# Altium footprint library IC.PcbLib: 163 footprints (part 8 of 11)
Each footprint in its own frame and in the unit in brackets; x right, y up, seen from the top. Pads: shape width x height; smd on the part's side, far side on the other; paste and mask are expansions set on the pad; w line width, h text height; cw(c..) or ccw(c..) is an arc to the next point about the centre after c.
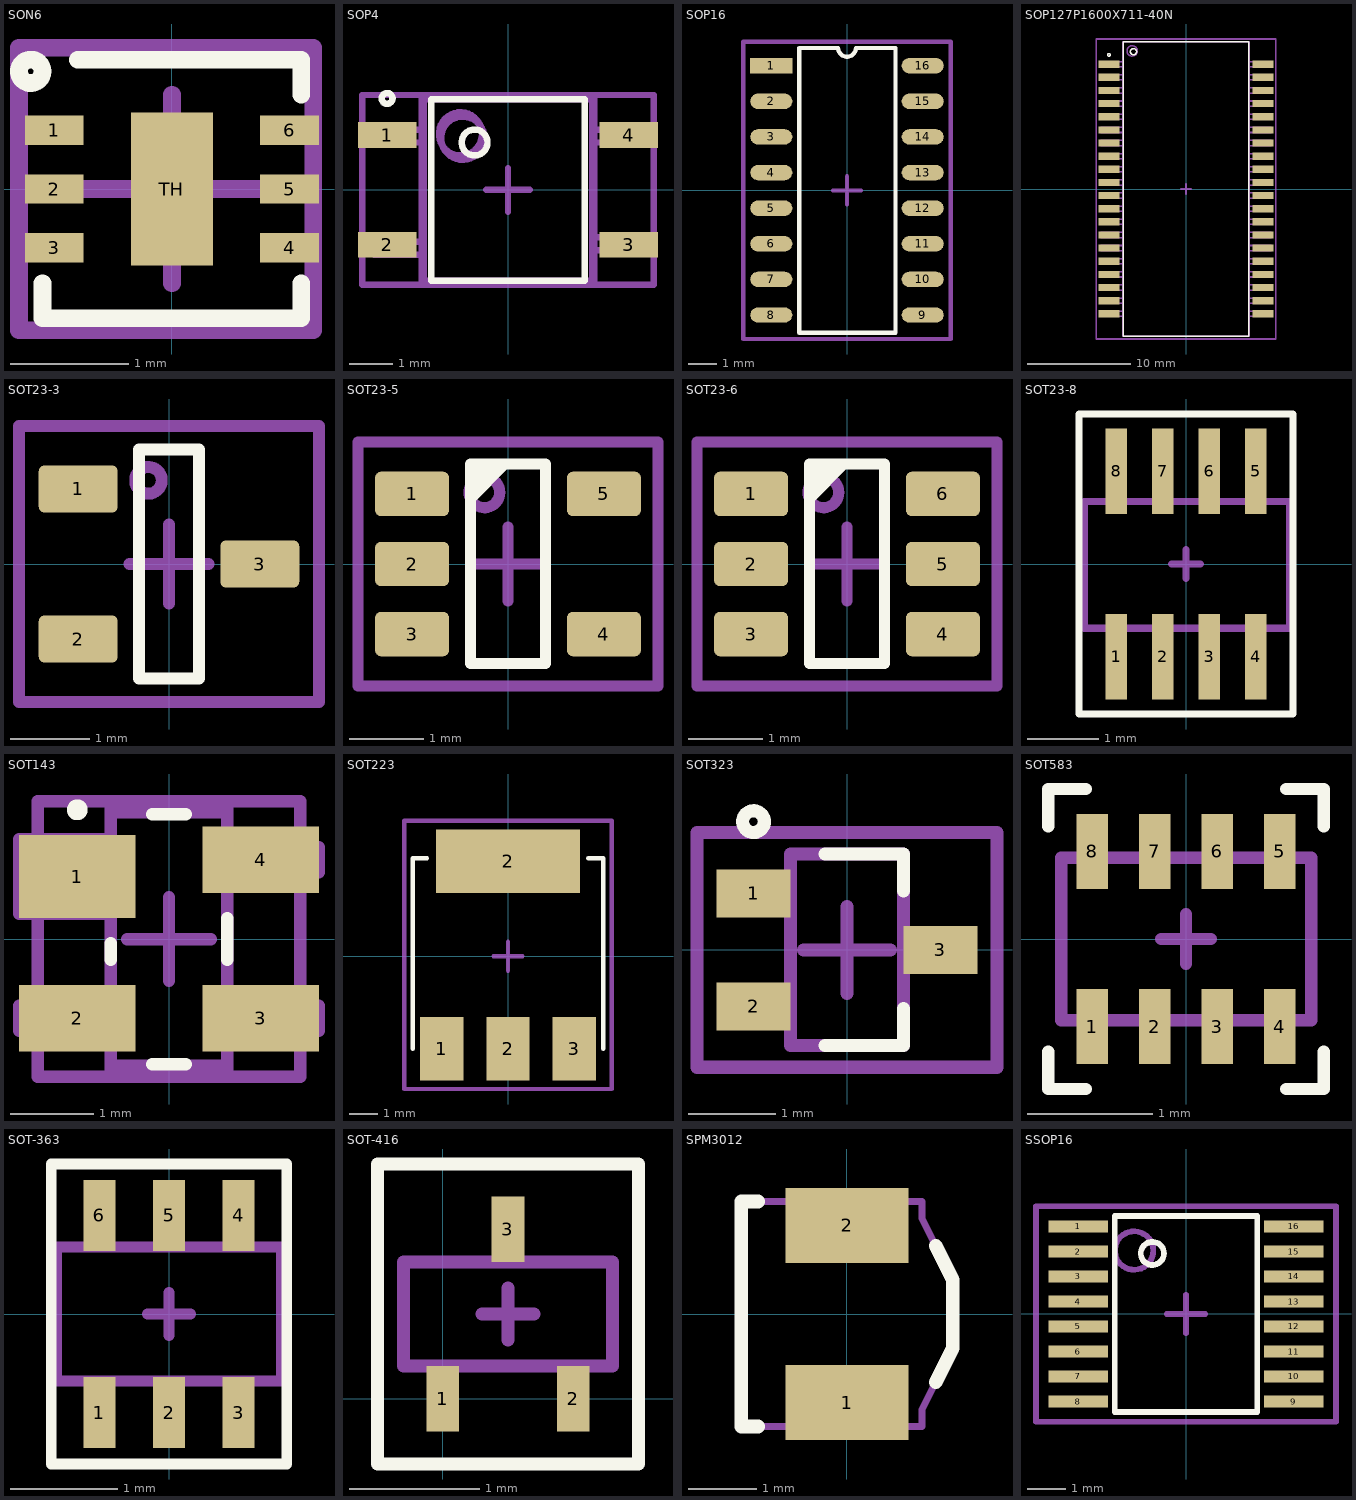
[diagram p7: the footprints below, top view; thin cyan lines are the x and y axes]

## SON6 [mm]
height 1
pads (7):
  rect 0.5x0.25 smd: 1(-1,0.5) 2(-1,0) 3(-1,-0.5) 4(1,-0.5) 5(1,0) 6(1,0.5)
  rect 0.7x1.3 smd: TH(0,0)
Top Overlay:
  circle w0.15: c-1.2,1 r0.1
  lines w0.15: -1.1,-0.8 -1.1,-1.1 1.1,-1.1 1.1,-0.8 ; -0.8,1.1 1.1,1.1 1.1,0.8
Mechanical 15:
  lines w0.15: -0.8,0 0,0 ; 0,-0.8 0,0 ; 0,0.8 0,0 ; 0.8,0 0,0 ; -1.3,-1.2 -1.3,1.2 1.2,1.2 1.2,-1.2 -1.3,-1.2
3D body: height 0.8, standoff 0, extent -1,-1 1,1

## SOP4 [mm] "SOP, 4-Leads, Body 4,00x3,79mm, Pitch 2,54mm, IPC High Density"
height 2.19
pads (4):
  rect 1.35x0.6 smd: 1(-2.8,1.27) 2(-2.8,-1.27) 3(2.8,-1.27) 4(2.8,1.27)
Top Overlay:
  circle w0.15: c-0.775,1.1 r0.3
  circle w0.15: c-2.8,2.12 r0.125
  lines w0.15: -1.775,-2.1 1.775,-2.1 1.775,2.1 -1.775,2.1 -1.775,-2.1
Mechanical 13:
  circle w0.15: c-1.05,1.2 r0.5
  lines w0.15: -1.95,-2.1 1.95,-2.1 1.95,2.1 -1.95,2.1 -1.95,-2.1
Mechanical 15:
  lines w0.15: -0.5,0 0.5,0 ; 0,-0.5 0,0.5 ; -3.375,-2.2 3.375,-2.2 3.375,2.2 -3.375,2.2 -3.375,-2.2
Mechanical 29:
  circle w0.15: c-1.1,1.3 r0.5
  lines w0.15: -2,-1.5 -3.1,-1.5 -3.1,-1.2 -2,-1.2 ; -2,1.1 -3.1,1.1 -3.1,1.4 -2,1.4 ; 2,-1.4 3.1,-1.4 3.1,-1.1 2,-1.1 ; 2,1.1 3.1,1.1 3.1,1.4 2,1.4 ; -2,-2.2 2,-2.2 2,2.2 -2,2.2 -2,-2.2
  text ".Designator" at -1.8,-0.5 h1
3D body "SOP4.step": height 2.18, standoff 0, extent -3.025,-2.1 3.025,2.1

## SOP16 [mm]
pads (16):
  rect 1.5x0.55 smd: 1(-2.7,4.445)
  oval 1.5x0.55 smd: 2(-2.7,3.175) 3(-2.7,1.905) 4(-2.7,0.635) 5(-2.7,-0.635) 6(-2.7,-1.905) 7(-2.7,-3.175) 8(-2.7,-4.445) 9(2.7,-4.445) 10(2.7,-3.175) 11(2.7,-1.905) 12(2.7,-0.635) 13(2.7,0.635) 14(2.7,1.905) 15(2.7,3.175) 16(2.7,4.445)
Top Overlay:
  lines w0.15: -1.7,-5.08 1.725,-5.08 1.725,5.08 0.318,5.08 cw(c0,5.08) -0.318,5.08 -1.7,5.08 -1.7,-5.08
  text "." at -2.7,5.145 h0.1
Mechanical 15:
  lines w0.15: -0.5,0 0.5,0 ; 0,-0.5 0,0.5 ; -3.7,-5.3 3.7,-5.3 3.7,5.3 -3.7,5.3 -3.7,-5.3
3D body "SOIC16.STEP": height 1.75, standoff 0, extent -3.1,-4.955 3.1,4.945

## SOP127P1600X711-40N [mm] "SOP, 40-Leads, Body 28,50x12,19mm, Pitch 1,27mm, IPC Medium Density"
height 7.11
pads (40):
  rect 2x0.7 smd: 1(-7.45,12.065) 2(-7.45,10.795) 3(-7.45,9.525) 4(-7.45,8.255) 5(-7.45,6.985) 6(-7.45,5.715) 7(-7.45,4.445) 8(-7.45,3.175) 9(-7.45,1.905) 10(-7.45,0.635) 11(-7.45,-0.635) 12(-7.45,-1.905) 13(-7.45,-3.175) 14(-7.45,-4.445) 15(-7.45,-5.715) 16(-7.45,-6.985) 17(-7.45,-8.255) 18(-7.45,-9.525) 19(-7.45,-10.795) 20(-7.45,-12.065) 21(7.45,-12.065) 22(7.45,-10.795) 23(7.45,-9.525) 24(7.45,-8.255) 25(7.45,-6.985) 26(7.45,-5.715) 27(7.45,-4.445) 28(7.45,-3.175) 29(7.45,-1.905) 30(7.45,-0.635) 31(7.45,0.635) 32(7.45,1.905) 33(7.45,3.175) 34(7.45,4.445) 35(7.45,5.715) 36(7.45,6.985) 37(7.45,8.255) 38(7.45,9.525) 39(7.45,10.795) 40(7.45,12.065)
Top Overlay:
  circle w0.15: c-7.45,12.965 r0.125
  circle w0.15: c-5.075,13.275 r0.3
  lines w0.15: -6.05,-14.25 -6.05,14.25 6.05,14.25 6.05,-14.25 -6.05,-14.25
Mechanical 15:
  lines w0.15: -0.5,0 0.5,0 ; 0,-0.5 0,0.5 ; -8.675,-14.5 -8.675,14.5 8.675,14.5 8.675,-14.5 -8.675,-14.5
Mechanical 29:
  circle w0.15: c-5.2,13.35 r0.5
  lines w0.15: -6.096,-12.319 -8.255,-12.319 -8.255,-11.811 -6.096,-11.811 ; -6.096,-11.049 -8.255,-11.049 -8.255,-10.541 -6.096,-10.541 ; -6.096,-9.779 -8.255,-9.779 -8.255,-9.271 -6.096,-9.271 ; -6.096,-8.509 -8.255,-8.509 -8.255,-8.001 -6.096,-8.001 ; -6.096,-7.239 -8.255,-7.239 -8.255,-6.731 -6.096,-6.731 ; -6.096,-5.969 -8.255,-5.969 -8.255,-5.461 -6.096,-5.461 ; -6.096,-4.699 -8.255,-4.699 -8.255,-4.191 -6.096,-4.191 ; -6.096,-3.429 -8.255,-3.429 -8.255,-2.921 -6.096,-2.921 ; -6.096,-2.159 -8.255,-2.159 -8.255,-1.651 -6.096,-1.651 ; -6.096,-0.889 -8.255,-0.889 -8.255,-0.381 -6.096,-0.381 ; -6.096,0.381 -8.255,0.381 -8.255,0.889 -6.096,0.889 ; -6.096,1.651 -8.255,1.651 -8.255,2.159 -6.096,2.159 ; -6.096,2.921 -8.255,2.921 -8.255,3.429 -6.096,3.429 ; -6.096,4.191 -8.255,4.191 -8.255,4.699 -6.096,4.699 ; -6.096,5.461 -8.255,5.461 -8.255,5.969 -6.096,5.969 ; -6.096,6.731 -8.255,6.731 -8.255,7.239 -6.096,7.239 ; -6.096,8.001 -8.255,8.001 -8.255,8.509 -6.096,8.509 ; -6.096,9.271 -8.255,9.271 -8.255,9.779 -6.096,9.779 ; -6.096,10.541 -8.255,10.541 -8.255,11.049 -6.096,11.049 ; -6.096,11.811 -8.255,11.811 -8.255,12.319 -6.096,12.319 ; 6.096,-12.319 8.255,-12.319 8.255,-11.811 6.096,-11.811 ; 6.096,-11.049 8.255,-11.049 8.255,-10.541 6.096,-10.541 ; 6.096,-9.779 8.255,-9.779 8.255,-9.271 6.096,-9.271 ; 6.096,-8.509 8.255,-8.509 8.255,-8.001 6.096,-8.001 ; 6.096,-7.239 8.255,-7.239 8.255,-6.731 6.096,-6.731 ; 6.096,-5.969 8.255,-5.969 8.255,-5.461 6.096,-5.461 ; 6.096,-4.699 8.255,-4.699 8.255,-4.191 6.096,-4.191 ; 6.096,-3.429 8.255,-3.429 8.255,-2.921 6.096,-2.921 ; 6.096,-2.159 8.255,-2.159 8.255,-1.651 6.096,-1.651 ; 6.096,-0.889 8.255,-0.889 8.255,-0.381 6.096,-0.381 ; 6.096,0.381 8.255,0.381 8.255,0.889 6.096,0.889 ; 6.096,1.651 8.255,1.651 8.255,2.159 6.096,2.159 ; 6.096,2.921 8.255,2.921 8.255,3.429 6.096,3.429 ; 6.096,4.191 8.255,4.191 8.255,4.699 6.096,4.699 ; 6.096,5.461 8.255,5.461 8.255,5.969 6.096,5.969 ; 6.096,6.731 8.255,6.731 8.255,7.239 6.096,7.239 ; 6.096,8.001 8.255,8.001 8.255,8.509 6.096,8.509 ; 6.096,9.271 8.255,9.271 8.255,9.779 6.096,9.779 ; 6.096,10.541 8.255,10.541 8.255,11.049 6.096,11.049 ; 6.096,11.811 8.255,11.811 8.255,12.319 6.096,12.319 ; -6.1,-14.25 -6.1,14.25 6.1,14.25 6.1,-14.25 -6.1,-14.25
  text ".Designator" at -3.2,-0.5 h1
3D body: height 7.11, standoff 0.25, extent -6.1,-14.25 6.1,14.25

## SOT23-3 [mm] "SOT23, 3 pin"
height 1.003
pads (3):
  rrect25% 1x0.6 smd: 1(-1.15,0.95) 2(-1.15,-0.95) 3(1.15,0)
Top Overlay:
  lines w0.15: -0.381,-1.45 -0.381,1.45 0.381,1.45 0.381,-1.45 -0.381,-1.45
  text "." at -2.125,0.95 h0.1
Mechanical 13:
  circle w0.15: c-0.26,1.06 r0.169
Mechanical 15:
  lines w0.15: -0.5,0 0.5,0 ; 0,-0.5 0,0.5 ; -1.9,-1.75 -1.9,1.75 1.9,1.75 1.9,-1.75 -1.9,-1.75
3D body: height 1.29, standoff -0.01, extent -1.4,-1.45 1.4,1.45

## SOT23-5 [mm]
height 1.6
pads (5):
  rrect25% 1x0.6 smd: 1(-1.3,0.95) 2(-1.3,0) 3(-1.3,-0.95) 4(1.3,-0.95) 5(1.3,0.95)
Top Overlay:
  region: -0.508,1.353 0.053,1.353 -0.508,0.792
  lines w0.15: -0.508,-1.347 0.508,-1.347 0.508,1.353 -0.508,1.353 -0.508,-1.347
  text "." at -2.275,0.95 h0.1
Mechanical 13:
  circle w0.15: c-0.32,0.97 r0.208
Mechanical 15:
  lines w0.15: -0.5,0 0.5,0 ; 0,-0.5 0,0.5 ; -2.032,-1.651 2.032,-1.651 2.032,1.651 -2.032,1.651 -2.032,-1.651
3D body: height 1.44, standoff -0.01, extent -1.4,-1.45 1.4,1.45

## SOT23-6 [mm]
height 1.6
pads (6):
  rrect25% 1x0.6 smd: 1(-1.3,0.95) 2(-1.3,0) 3(-1.3,-0.95) 4(1.3,-0.95) 5(1.3,0) 6(1.3,0.95)
Top Overlay:
  region: -0.508,1.353 0.053,1.353 -0.508,0.792
  lines w0.15: -0.508,-1.347 -0.508,1.353 0.508,1.353 0.508,-1.347 -0.508,-1.347
  text "." at -2.275,0.95 h0.1
Mechanical 13:
  circle w0.15: c-0.32,0.97 r0.208
Mechanical 15:
  lines w0.15: -0.5,0 0.5,0 ; 0,-0.5 0,0.5 ; -2.032,-1.651 -2.032,1.651 2.032,1.651 2.032,-1.651 -2.032,-1.651
3D body: height 1.44, standoff -0.01, extent -1.4,-1.45 1.4,1.45

## SOT23-8 [mm]
pads (8):
  rect 0.3x1.2 smd: 1(-0.975,-1.3) 2(-0.325,-1.3) 3(0.325,-1.3) 4(0.975,-1.3) 5(0.975,1.3) 6(0.325,1.3) 7(-0.325,1.3) 8(-0.975,1.3)
Top Overlay:
  lines w0.1: -1.5,-2.1 1.5,-2.1 1.5,2.1 -1.5,2.1 -1.5,-2.1
Mechanical 32:
  lines w0.1: -0.2,0 0.2,0 ; 0,-0.2 0,0.2 ; -1.425,-0.9 -1.425,0.875 1.45,0.875 1.45,-0.9 -1.425,-0.9
3D body: height 0.2, standoff 0.1, extent -1.125,-1.4 -0.825,-0.9
3D body: height 0.2, standoff 0.1, extent -0.475,-1.4 -0.175,-0.9
3D body: height 0.2, standoff 0.1, extent 0.825,-1.4 1.125,-0.9
3D body: height 0.2, standoff 0.1, extent 0.175,-1.4 0.475,-0.9
3D body: height 0.2, standoff 0.1, extent 0.825,0.9 1.125,1.4
3D body: height 0.2, standoff 0.1, extent 0.175,0.9 0.475,1.4
3D body: height 0.2, standoff 0.1, extent -1.125,0.9 -0.825,1.4
3D body: height 0.2, standoff 0.1, extent -0.475,0.9 -0.175,1.4
3D body: height 1, standoff 0.1, extent -1.45,-0.9 1.45,0.9

## SOT143 [mm] "SOT143, 4-Leads, Body 2,92x2,37mm, Pitch 1,90mm, IPC High Density"
height 1.2
pads (4):
  rect 1.4x1 smd: 1(-1.1,0.75)
  rect 1.4x0.8 smd: 2(-1.1,-0.95) 3(1.1,-0.95) 4(1.1,0.95)
Top Overlay:
  circle w0.15: c-1.1,1.55 r0.05
  lines w0.15: -0.7,-0.25 -0.7,-0.05 ; -0.2,-1.5 0.2,-1.5 ; -0.2,1.5 0.2,1.5 ; 0.7,-0.25 0.7,0.25
Mechanical 13:
  lines w0.15: -0.7,-1.52 0.7,-1.52 0.7,1.52 -0.7,1.52 -0.7,-1.52
Mechanical 15:
  lines w0.15: -0.5,0 0.5,0 ; 0,-0.5 0,0.5 ; -1.575,-1.65 1.575,-1.65 1.575,1.65 -1.575,1.65 -1.575,-1.65
Mechanical 29:
  lines w0.15: -0.7,-1.1 -1.8,-1.1 -1.8,-0.8 -0.7,-0.8 ; -0.7,0.3 -1.8,0.3 -1.8,1.2 -0.7,1.2 ; 0.7,-1.1 1.8,-1.1 1.8,-0.8 0.7,-0.8 ; 0.7,0.8 1.8,0.8 1.8,1.1 0.7,1.1 ; -0.7,-1.6 0.7,-1.6 0.7,1.6 -0.7,1.6 -0.7,-1.6
3D body "SOT143.step": height 1.2, standoff 0.01, extent -1.179,-1.52 1.179,1.52

## SOT223 [mm]
pads (4):
  rect 1.5x2.2 smd: 1(-2.3,-3.2) 2(0,-3.2) 3(2.3,-3.2)
  rect 5x2.2 smd: 2(0,3.3)
Top Overlay:
  lines w0.15: -3.3,-3.2 -3.3,3.404 -2.808,3.404 ; 2.78,3.404 3.3,3.404 3.3,-3.2
  text "." at -3.6,-3.7 h0.1
Mechanical 15:
  lines w0.15: -0.5,0 0.5,0 ; 0,-0.5 0,0.5 ; -3.6,-4.6 3.6,-4.6 3.6,4.7 -3.6,4.7 -3.6,-4.6
3D body "SW3dPS-SOT-223-1.STEP": height 1.64, standoff -0.01, extent -3.25,-3.398 3.25,3.602

## SOT323 [mm] "SOT323, 3-Leads, Body 2,00x2,10mm, Pitch 0,65mm, IPC Medium Density"
height 1.1
pads (3):
  rect 0.85x0.55 smd: 1(-1.075,0.65) 2(-1.075,-0.65) 3(1.075,0)
Top Overlay:
  circle w0.15: c-1.075,1.475 r0.125
  lines w0.15: -0.25,-1.1 0.65,-1.1 0.65,-0.675 ; -0.25,1.1 0.65,1.1 0.65,0.675
Mechanical 13:
  lines w0.15: -0.65,-1.1 -0.65,1.1 0.65,1.1 0.65,-1.1 -0.65,-1.1
Mechanical 15:
  lines w0.15: -0.5,0 0.5,0 ; 0,-0.5 0,0.5 ; -1.725,-1.35 -1.725,1.35 1.725,1.35 1.725,-1.35 -1.725,-1.35
3D body: height 1.1, standoff 0.1, extent -0.65,-1.1 0.65,1.1

## SOT583 [mm]
pads (8):
  rect 0.25x0.6 smd: 1(-0.75,-0.7) 2(-0.25,-0.7) 3(0.25,-0.7) 4(0.75,-0.7) 5(0.75,0.7) 6(0.25,0.7) 7(-0.25,0.7) 8(-0.75,0.7)
Top Overlay:
  lines w0.1: -1.1,-0.9 -1.1,-1.2 -0.8,-1.2 ; -1.1,0.9 -1.1,1.2 -0.8,1.2 ; 0.8,-1.2 1.1,-1.2 1.1,-0.9 ; 0.8,1.2 1.1,1.2 1.1,0.9
Mechanical 32:
  lines w0.1: -0.2,0 0.2,0 ; 0,-0.2 0,0.2 ; -1,-0.65 -1,0.65 1,0.65 1,-0.65 -1,-0.65
3D body: height 0.6, standoff 0.1, extent -1,-0.65 1,0.65
3D body: height 0.2, standoff 0.1, extent 0.613,0.65 0.888,0.85
3D body: height 0.2, standoff 0.1, extent 0.113,0.65 0.388,0.85
3D body: height 0.2, standoff 0.1, extent -0.387,0.65 -0.112,0.85
3D body: height 0.2, standoff 0.1, extent -0.887,0.65 -0.612,0.85
3D body: height 0.2, standoff 0.1, extent 0.612,-0.85 0.887,-0.65
3D body: height 0.2, standoff 0.1, extent 0.112,-0.85 0.387,-0.65
3D body: height 0.2, standoff 0.1, extent -0.388,-0.85 -0.113,-0.65
3D body: height 0.2, standoff 0.1, extent -0.888,-0.85 -0.613,-0.65

## SOT-363 [mm]
pads (6):
  rect 0.3x0.66 smd: 1(-0.65,-0.92) 2(0,-0.92) 3(0.65,-0.92) 4(0.65,0.92) 5(0,0.92) 6(-0.65,0.92)
Top Overlay:
  lines w0.1: -1.1,-1.4 -1.1,1.4 1.1,1.4 1.1,-1.4 -1.1,-1.4
Mechanical 32:
  lines w0.1: -0.2,0 0.2,0 ; 0,-0.2 0,0.2 ; -1.05,-0.625 -1.05,0.625 1.05,0.625 1.05,-0.625 -1.05,-0.625
3D body: height 0.15, standoff 0.01, extent 0.5,-1.038 0.8,-0.613
3D body: height 0.15, standoff 0.01, extent -0.15,-1.038 0.15,-0.613
3D body: height 0.15, standoff 0.01, extent -0.8,-1.038 -0.5,-0.613
3D body: height 0.15, standoff 0.01, extent -0.8,0.613 -0.5,1.038
3D body: height 0.15, standoff 0.01, extent -0.15,0.613 0.15,1.038
3D body: height 0.15, standoff 0.01, extent 0.5,0.613 0.8,1.038
3D body: height 1.1, standoff 0.1, extent -1.05,-0.625 1.05,0.625

## SOT-416 [mm]
pads (3):
  rect 0.25x0.5 smd: 1(0,0) 2(1,0) 3(0.5,1.3)
Top Overlay:
  lines w0.1: -0.5,-0.5 -0.5,1.8 1.5,1.8 1.5,-0.5 -0.5,-0.5
Mechanical 32:
  lines w0.1: 0.3,0.65 0.5,0.65 ; 0.5,0.45 0.5,0.65 ; 0.5,0.85 0.5,0.65 ; 0.7,0.65 0.5,0.65 ; -0.3,0.25 1.3,0.25 1.3,1.05 -0.3,1.05 -0.3,0.25
3D body: height 0.9, standoff 0.1, extent -0.3,0.25 1.3,1.05
3D body: height 0.6, standoff 0.05, extent 0.4,1.05 0.6,1.25
3D body: height 0.2, standoff 0.05, extent 0.4,1.25 0.6,1.45
3D body: height 0.6, standoff 0.05, extent -0.1,0.05 0.1,0.25
3D body: height 0.2, standoff 0.05, extent -0.1,-0.15 0.1,0.05
3D body: height 0.6, standoff 0.05, extent 0.9,0.05 1.1,0.25
3D body: height 0.2, standoff 0.05, extent 0.9,-0.15 1.1,0.05

## SPM3012 [mm]
pads (2):
  rect 1.8x1.1 smd: 1(0,-1.3) 2(0,1.3)
Top Overlay:
  lines w0.2: -1.3,-1.65 -1.55,-1.65 -1.55,1.65 -1.3,1.65 ; 1.3,-1 1.55,-0.5 1.55,0.5 1.3,1
Mechanical 5:
  lines w0.1: -1.55,-1.65 1.1,-1.65 1.1,-1.4 1.55,-0.5 1.55,0.5 1.1,1.4 1.1,1.65 -1.55,1.65 -1.55,-1.65
3D body: height 1.2, standoff 0, extent -1.55,-1.65 1.55,1.65

## SSOP16 [mm]
height 1.2
pads (16):
  rect 1.55x0.3 smd: 1(-2.8,2.275) 2(-2.8,1.625) 3(-2.8,0.975) 4(-2.8,0.325) 5(-2.8,-0.325) 6(-2.8,-0.975) 7(-2.8,-1.625) 8(-2.8,-2.275) 9(2.8,-2.275) 10(2.8,-1.625) 11(2.8,-0.975) 12(2.8,-0.325) 13(2.8,0.325) 14(2.8,0.975) 15(2.8,1.625) 16(2.8,2.275)
Top Overlay:
  circle w0.15: c-0.875,1.575 r0.3
  lines w0.15: -1.85,-2.55 -1.85,2.55 1.85,2.55 1.85,-2.55 -1.85,-2.55
  text "." at -2.8,2.9 h0.1
Mechanical 13:
  circle w0.15: c-1.35,1.65 r0.5
Mechanical 15:
  lines w0.15: -0.5,0 0.5,0 ; 0,-0.5 0,0.5 ; -3.9,-2.8 -3.9,2.8 3.9,2.8 3.9,-2.8 -3.9,-2.8